# Altium footprint library ICs.PcbLib: 191 footprints (part 7 of 12)
Each footprint in its own frame and in the unit in brackets; x right, y up, seen from the top. Pads: shape width x height; smd on the part's side, far side on the other; paste and mask are expansions set on the pad; w line width, h text height; cw(c..) or ccw(c..) is an arc to the next point about the centre after c.
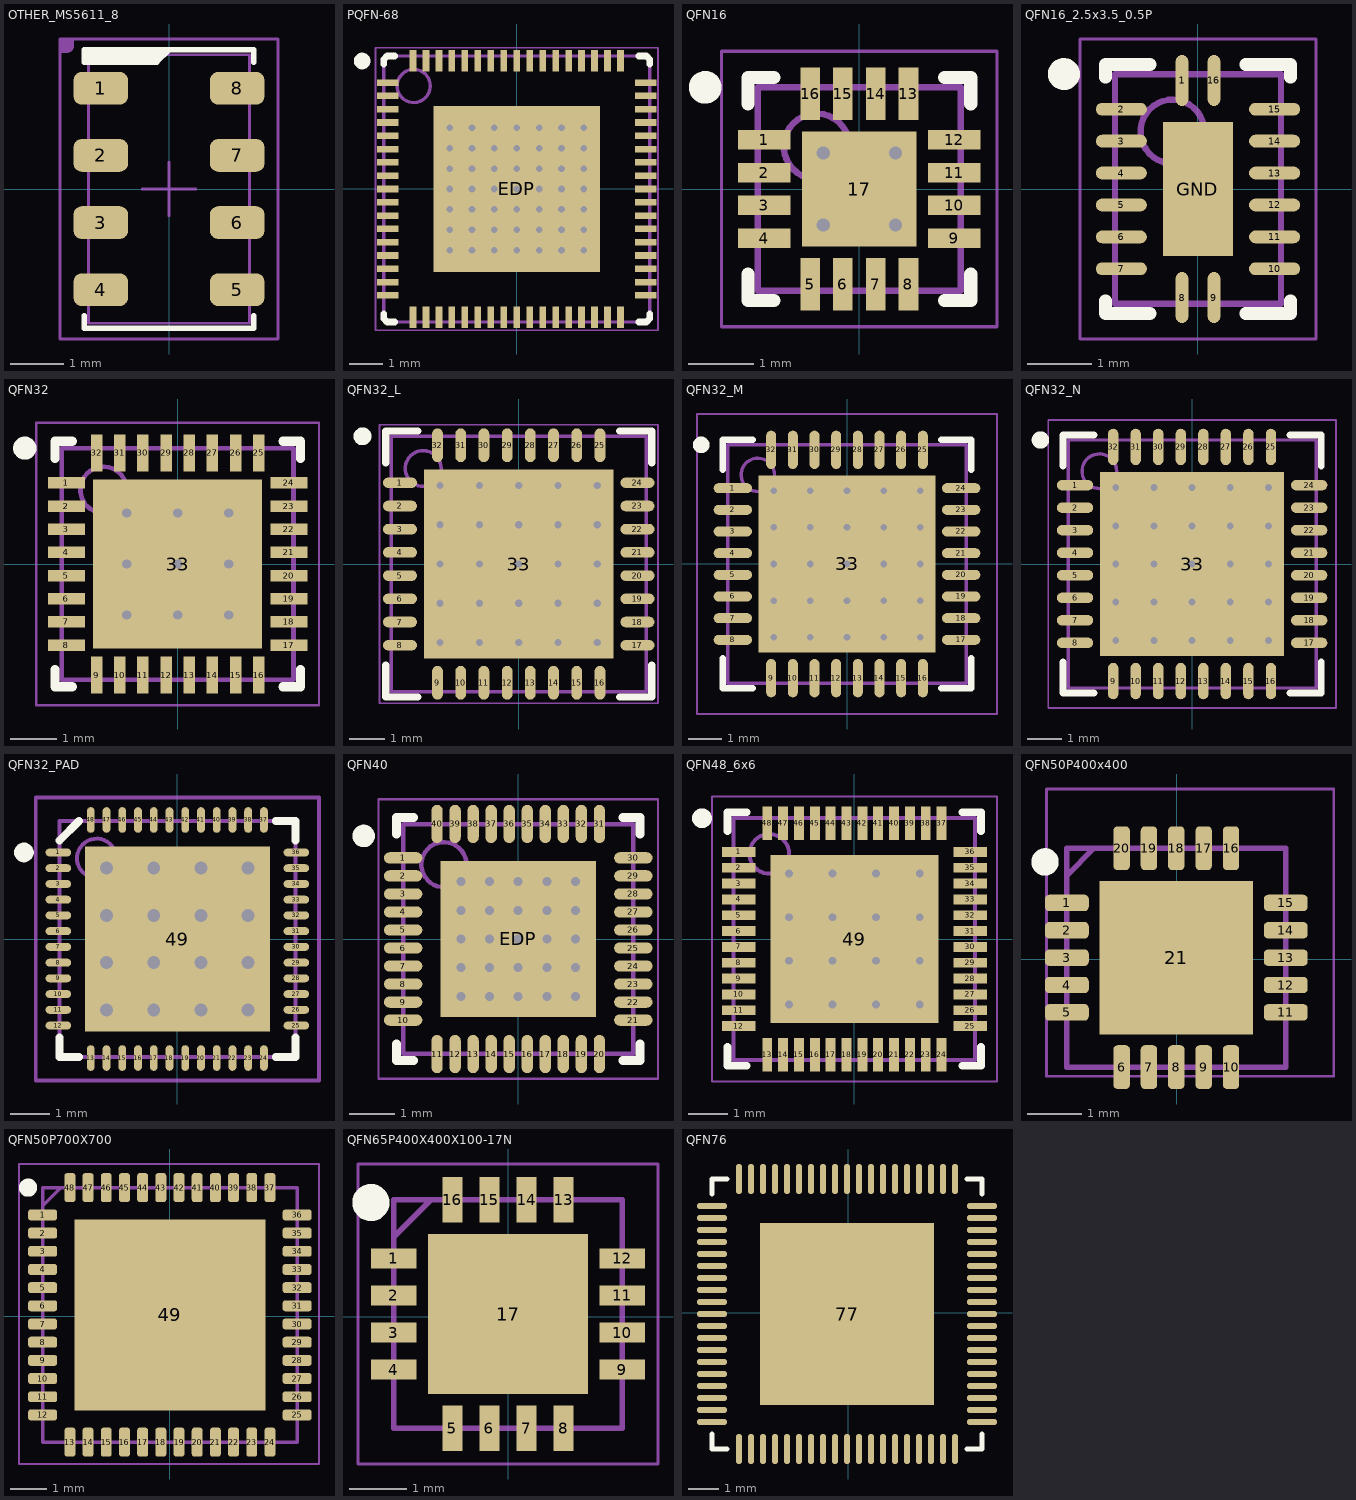
[diagram p6: the footprints below, top view; thin cyan lines are the x and y axes]

## OTHER_MS5611_8 [mil]
height 39.37
pads (8):
  rrect50% 40x24 smd: 1(-50,73.82) 2(-50,24.61) 3(-50,-24.61) 4(-50,-73.82) 5(50,-73.82) 6(50,-24.61) 7(50,24.61) 8(50,73.82)
Top Overlay:
  region: -62,102 0,102 -9,93 -62,93
  lines w4: -62,-93 -62,-102 62,-102 62,-93 ; 0,102 -9,93 -62,93 -62,102 62,102 62,93
Mechanical 13:
  lines w2: -19.68,0 19.68,0 ; 0,-19.68 0,19.68 ; -59.06,-98.43 59.06,-98.43 59.06,98.43 -59.06,98.43 -59.06,-98.43
Mechanical 14:
  region: -80,110 -70,110 -70,105 -70,104.01 -70.76,102.17 -72.17,100.76 -74.01,100 -75,100 -80,100
  lines w2: -80,-110 -80,110 80,110 80,-110 -80,-110
  text ".Designator" at -41,-25 h100
3D body "User Library-CRYSTALSMD5X32.STEP": height 39.37, standoff 0, extent -62.99,-98.43 63,98.43

## PQFN-68 [mm] "PQFN, 68-Leads, Body 7.95x7.95mm, Pitch 0.39mm/0.40mm, Thermal Pad 5.00x5.00mm, IPC Medium Density"
height 0.8
pads (69):
  rect 0.65x0.2 smd: 1(-3.88,3.2) 2(-3.88,2.8) 3(-3.88,2.4) 4(-3.88,2) 5(-3.88,1.6) 6(-3.88,1.2) 7(-3.88,0.8) 8(-3.88,0.4) 9(-3.88,0) 10(-3.88,-0.4) 11(-3.88,-0.8) 12(-3.88,-1.2) 13(-3.88,-1.6) 14(-3.88,-2) 15(-3.88,-2.4) 16(-3.88,-2.8) 17(-3.88,-3.2) 35(3.88,-3.2) 36(3.88,-2.8) 37(3.88,-2.4) 38(3.88,-2) 39(3.88,-1.6) 40(3.88,-1.2) 41(3.88,-0.8) 42(3.88,-0.4) 43(3.88,0) 44(3.88,0.4) 45(3.88,0.8) 46(3.88,1.2) 47(3.88,1.6) 48(3.88,2) 49(3.88,2.4) 50(3.88,2.8) 51(3.88,3.2)
  rect 0.2x0.65 smd: 18(-3.12,-3.854) 19(-2.73,-3.854) 20(-2.34,-3.854) 21(-1.95,-3.854) 22(-1.56,-3.854) 23(-1.17,-3.854) 24(-0.78,-3.854) 25(-0.39,-3.854) 26(0,-3.854) 27(0.39,-3.854) 28(0.78,-3.854) 29(1.17,-3.854) 30(1.56,-3.854) 31(1.95,-3.854) 32(2.34,-3.854) 33(2.73,-3.854) 34(3.12,-3.854) 52(3.12,3.854) 53(2.73,3.854) 54(2.34,3.854) 55(1.95,3.854) 56(1.56,3.854) 57(1.17,3.854) 58(0.78,3.854) 59(0.39,3.854) 60(0,3.854) 61(-0.39,3.854) 62(-0.78,3.854) 63(-1.17,3.854) 64(-1.56,3.854) 65(-1.95,3.854) 66(-2.34,3.854) 67(-2.73,3.854) 68(-3.12,3.854)
  rect 5x5 smd: EDP(0,0)
via 2.018,1.227 diameter 0.5 hole 0.2
via 2.018,0.613 diameter 0.5 hole 0.2
via 2.018,-1.84 diameter 0.5 hole 0.2
via 2.018,-1.227 diameter 0.5 hole 0.2
via 2.018,-0.613 diameter 0.5 hole 0.2
via 2.018,0 diameter 0.5 hole 0.2
via 2.018,1.84 diameter 0.5 hole 0.2
via 1.346,1.227 diameter 0.5 hole 0.2
via 1.346,0.613 diameter 0.5 hole 0.2
via 1.346,-1.84 diameter 0.5 hole 0.2
via 1.346,-1.227 diameter 0.5 hole 0.2
via 1.346,-0.613 diameter 0.5 hole 0.2
via 1.346,0 diameter 0.5 hole 0.2
via 1.346,1.84 diameter 0.5 hole 0.2
via 0,1.84 diameter 0.5 hole 0.2
via -0.673,1.84 diameter 0.5 hole 0.2
via -1.346,1.84 diameter 0.5 hole 0.2
via -2.018,1.84 diameter 0.5 hole 0.2
via 0.673,1.84 diameter 0.5 hole 0.2
via 0.673,0 diameter 0.5 hole 0.2
via 0.673,-0.613 diameter 0.5 hole 0.2
via 0.673,-1.227 diameter 0.5 hole 0.2
via 0.673,-1.84 diameter 0.5 hole 0.2
via 0.673,0.613 diameter 0.5 hole 0.2
via 0.673,1.227 diameter 0.5 hole 0.2
via -2.018,1.227 diameter 0.5 hole 0.2
via -1.346,1.227 diameter 0.5 hole 0.2
via -0.673,1.227 diameter 0.5 hole 0.2
via 0,1.227 diameter 0.5 hole 0.2
via -2.018,0.613 diameter 0.5 hole 0.2
via -1.346,0.613 diameter 0.5 hole 0.2
via -0.673,0.613 diameter 0.5 hole 0.2
via 0,0.613 diameter 0.5 hole 0.2
via 0,-1.84 diameter 0.5 hole 0.2
via -0.673,-1.84 diameter 0.5 hole 0.2
via -1.346,-1.84 diameter 0.5 hole 0.2
via -2.018,-1.84 diameter 0.5 hole 0.2
via 0,-1.227 diameter 0.5 hole 0.2
via -0.673,-1.227 diameter 0.5 hole 0.2
via -1.346,-1.227 diameter 0.5 hole 0.2
via -2.018,-1.227 diameter 0.5 hole 0.2
via 0,-0.613 diameter 0.5 hole 0.2
via -0.673,-0.613 diameter 0.5 hole 0.2
via -1.346,-0.613 diameter 0.5 hole 0.2
via -2.018,-0.613 diameter 0.5 hole 0.2
via 0,0 diameter 0.5 hole 0.2
via -0.673,0 diameter 0.5 hole 0.2
via -1.346,0 diameter 0.5 hole 0.2
via -2.018,0 diameter 0.5 hole 0.2
Top Overlay:
  circle w0.25: c-4.65,3.85 r0.125
  lines w0.2: -4,-3.75 -4,-3.9 -3.9,-4 -3.67,-4 ; -4,3.75 -4,3.9 -3.9,4 -3.67,4 ; 3.67,-4 3.9,-4 4,-3.9 4,-3.75 ; 3.67,4 3.9,4 4,3.9 4,3.75
Assembly Top:
  circle w0.1: c-3.1,3.1 r0.5
  lines w0.1: -4,-3.9 -4,3.9 -3.9,4 3.9,4 4,3.9 4,-3.9 3.9,-4 -3.9,-4 -4,-3.9
Courtyard Top:
  lines w0.05: -4.25,-4.25 4.25,-4.25 4.25,4.25 -4.25,4.25 -4.25,-4.25
  lines w0.1: -0.5,0 0.5,0 ; 0,-0.5 0,0.5
3D body "PQFN-68.step": height 0.8, standoff 0, extent -4,-4 4,4

## QFN16 [mm]
height 0.75
pads (17):
  rect 0.8x0.3 smd: 1(-1.45,0.75) 2(-1.45,0.25) 3(-1.45,-0.25) 4(-1.45,-0.75) 9(1.45,-0.75) 10(1.45,-0.25) 11(1.45,0.25) 12(1.45,0.75)
  rect 0.3x0.8 smd: 5(-0.75,-1.45) 6(-0.25,-1.45) 7(0.25,-1.45) 8(0.75,-1.45) 13(0.75,1.45) 14(0.25,1.45) 15(-0.25,1.45) 16(-0.75,1.45)
  rect 1.75x1.75 smd: 17(0,0)
via -0.55,0.55 diameter 0.5 hole 0.2
via 0.55,0.55 diameter 0.5 hole 0.2
via -0.55,-0.55 diameter 0.5 hole 0.2
via 0.55,-0.55 diameter 0.5 hole 0.2
Top Overlay:
  circle w0.25: c-2.35,1.55 r0.125
  lines w0.2: -1.7,-1.3 -1.7,-1.7 -1.3,-1.7 ; -1.7,1.3 -1.7,1.7 -1.3,1.7 ; 1.3,-1.7 1.7,-1.7 1.7,-1.3 ; 1.3,1.7 1.7,1.7 1.7,1.3
Mechanical 13:
  circle w0.1: c-0.65,0.65 r0.5
  lines w0.1: -1.55,-1.55 -1.55,1.55 1.55,1.55 1.55,-1.55 -1.55,-1.55
Mechanical 15:
  lines w0.05: -2.1,-2.1 -2.1,2.1 2.1,2.1 2.1,-2.1 -2.1,-2.1
  lines w0.1: -0.5,0 0.5,0 ; 0,-0.5 0,0.5
3D body "QFN16.step": height 0.75, standoff 0, extent -1.56,-1.56 1.56,1.56

## QFN16_2.5x3.5_0.5P [mm]
height 0.8
pads (17):
  oval 0.2x0.8 smd: 1(-0.25,1.7) 8(-0.25,-1.7) 9(0.25,-1.7) 16(0.25,1.7)
  oval 0.8x0.2 smd: 2(-1.2,1.25) 3(-1.2,0.75) 4(-1.2,0.25) 5(-1.2,-0.25) 6(-1.2,-0.75) 7(-1.2,-1.25) 10(1.2,-1.25) 11(1.2,-0.75) 12(1.2,-0.25) 13(1.2,0.25) 14(1.2,0.75) 15(1.2,1.25)
  rect 1.1x2.1 smd: GND(0,0)
Top Overlay:
  circle w0.25: c-2.1,1.8 r0.125
  lines w0.2: -1.45,-1.75 -1.45,-1.95 -0.75,-1.95 ; -1.45,1.75 -1.45,1.95 -0.75,1.95 ; 0.75,-1.95 1.45,-1.95 1.45,-1.75 ; 0.75,1.95 1.45,1.95 1.45,1.75
Mechanical 13:
  circle w0.1: c-0.4,0.9 r0.5
  lines w0.1: -1.3,-1.8 -1.3,1.8 1.3,1.8 1.3,-1.8 -1.3,-1.8
Mechanical 15:
  lines w0.05: -1.85,-2.35 -1.85,2.35 1.85,2.35 1.85,-2.35 -1.85,-2.35
  lines w0.1: -0.5,0 0.5,0 ; 0,-0.5 0,0.5
3D body "QFN116_2.5x3.5_0.5P.step": height 0.8, standoff 0, extent -1.32,-1.82 1.32,1.82

## QFN32 [mm]
height 0.75
pads (33):
  rect 0.8x0.25 smd: 1(-2.4,1.75) 2(-2.4,1.25) 3(-2.4,0.75) 4(-2.4,0.25) 5(-2.4,-0.25) 6(-2.4,-0.75) 7(-2.4,-1.25) 8(-2.4,-1.75) 17(2.4,-1.75) 18(2.4,-1.25) 19(2.4,-0.75) 20(2.4,-0.25) 21(2.4,0.25) 22(2.4,0.75) 23(2.4,1.25) 24(2.4,1.75)
  rect 0.25x0.8 smd: 9(-1.75,-2.4) 10(-1.25,-2.4) 11(-0.75,-2.4) 12(-0.25,-2.4) 13(0.25,-2.4) 14(0.75,-2.4) 15(1.25,-2.4) 16(1.75,-2.4) 25(1.75,2.4) 26(1.25,2.4) 27(0.75,2.4) 28(0.25,2.4) 29(-0.25,2.4) 30(-0.75,2.4) 31(-1.25,2.4) 32(-1.75,2.4)
  rect 3.65x3.65 smd: 33(0,0)
via 1.1,-1.1 diameter 0.5 hole 0.2
via 0,-1.1 diameter 0.5 hole 0.2
via -1.1,-1.1 diameter 0.5 hole 0.2
via 1.1,0 diameter 0.5 hole 0.2
via 0,0 diameter 0.5 hole 0.2
via -1.1,0 diameter 0.5 hole 0.2
via 1.1,1.1 diameter 0.5 hole 0.2
via 0,1.1 diameter 0.5 hole 0.2
via -1.1,1.1 diameter 0.5 hole 0.2
Top Overlay:
  circle w0.25: c-3.3,2.5 r0.125
  lines w0.2: -2.65,-2.275 -2.65,-2.65 -2.275,-2.65 ; -2.65,2.275 -2.65,2.65 -2.275,2.65 ; 2.275,-2.65 2.65,-2.65 2.65,-2.275 ; 2.275,2.65 2.65,2.65 2.65,2.275
Mechanical 13:
  circle w0.1: c-1.6,1.6 r0.5
  lines w0.1: -2.5,-2.5 2.5,-2.5 2.5,2.5 -2.5,2.5 -2.5,-2.5
Mechanical 15:
  lines w0.05: -3.05,-3.05 3.05,-3.05 3.05,3.05 -3.05,3.05 -3.05,-3.05
  lines w0.1: -0.5,0 0.5,0 ; 0,-0.5 0,0.5
3D body "QFN32.step": height 0.75, standoff 0, extent -2.51,-2.51 2.51,2.51

## QFN32_L [mm] "QFN, 32-Leads, Body 7x7mm, Pitch 0.65mm, Thermal Pad 5.3x5.3mm, IPC High Density"
height 1
pads (33):
  oval 0.95x0.3 smd: 1(-3.325,2.275) 2(-3.325,1.625) 3(-3.325,0.975) 4(-3.325,0.325) 5(-3.325,-0.325) 6(-3.325,-0.975) 7(-3.325,-1.625) 8(-3.325,-2.275) 17(3.325,-2.275) 18(3.325,-1.625) 19(3.325,-0.975) 20(3.325,-0.325) 21(3.325,0.325) 22(3.325,0.975) 23(3.325,1.625) 24(3.325,2.275)
  oval 0.3x0.95 smd: 9(-2.275,-3.325) 10(-1.625,-3.325) 11(-0.975,-3.325) 12(-0.325,-3.325) 13(0.325,-3.325) 14(0.975,-3.325) 15(1.625,-3.325) 16(2.275,-3.325) 25(2.275,3.325) 26(1.625,3.325) 27(0.975,3.325) 28(0.325,3.325) 29(-0.325,3.325) 30(-0.975,3.325) 31(-1.625,3.325) 32(-2.275,3.325)
  rect 5.3x5.3 smd: 33(0,0)
via -2.2,2.2 diameter 0.5 hole 0.2
via -1.1,2.2 diameter 0.5 hole 0.2
via 0,2.2 diameter 0.5 hole 0.2
via 1.1,2.2 diameter 0.5 hole 0.2
via 2.2,2.2 diameter 0.5 hole 0.2
via -2.2,1.1 diameter 0.5 hole 0.2
via -1.1,1.1 diameter 0.5 hole 0.2
via 0,1.1 diameter 0.5 hole 0.2
via 1.1,1.1 diameter 0.5 hole 0.2
via 2.2,1.1 diameter 0.5 hole 0.2
via -2.2,0 diameter 0.5 hole 0.2
via -1.1,0 diameter 0.5 hole 0.2
via 0,0 diameter 0.5 hole 0.2
via 1.1,0 diameter 0.5 hole 0.2
via 2.2,0 diameter 0.5 hole 0.2
via -2.2,-1.1 diameter 0.5 hole 0.2
via -1.1,-1.1 diameter 0.5 hole 0.2
via 0,-1.1 diameter 0.5 hole 0.2
via 1.1,-1.1 diameter 0.5 hole 0.2
via 2.2,-1.1 diameter 0.5 hole 0.2
via -2.2,-2.2 diameter 0.5 hole 0.2
via -1.1,-2.2 diameter 0.5 hole 0.2
via 0,-2.2 diameter 0.5 hole 0.2
via 1.1,-2.2 diameter 0.5 hole 0.2
via 2.2,-2.2 diameter 0.5 hole 0.2
Top Overlay:
  circle w0.25: c-4.375,3.575 r0.125
  lines w0.2: -3.725,-2.825 -3.725,-3.725 -2.825,-3.725 ; -3.725,2.825 -3.725,3.725 -2.825,3.725 ; 2.825,-3.725 3.725,-3.725 3.725,-2.825 ; 2.825,3.725 3.725,3.725 3.725,2.825
Mechanical 13:
  circle w0.1: c-2.675,2.675 r0.5
  lines w0.1: -3.575,-3.575 -3.575,3.575 3.575,3.575 3.575,-3.575 -3.575,-3.575
Mechanical 15:
  lines w0.05: -3.9,-3.9 -3.9,3.9 3.9,3.9 3.9,-3.9 -3.9,-3.9
  lines w0.1: -0.5,0 0.5,0 ; 0,-0.5 0,0.5
3D body: height 1, standoff 0, extent -3.575,-3.575 3.575,3.575

## QFN32_M [mm] "QFN, 32-Leads, Body 7x7mm, Pitch 0.65mm, Thermal Pad 5.3x5.3mm, IPC Low Density"
height 1
pads (33):
  oval 1.15x0.3 smd: 1(-3.425,2.275) 2(-3.425,1.625) 3(-3.425,0.975) 4(-3.425,0.325) 5(-3.425,-0.325) 6(-3.425,-0.975) 7(-3.425,-1.625) 8(-3.425,-2.275) 17(3.425,-2.275) 18(3.425,-1.625) 19(3.425,-0.975) 20(3.425,-0.325) 21(3.425,0.325) 22(3.425,0.975) 23(3.425,1.625) 24(3.425,2.275)
  oval 0.3x1.15 smd: 9(-2.275,-3.425) 10(-1.625,-3.425) 11(-0.975,-3.425) 12(-0.325,-3.425) 13(0.325,-3.425) 14(0.975,-3.425) 15(1.625,-3.425) 16(2.275,-3.425) 25(2.275,3.425) 26(1.625,3.425) 27(0.975,3.425) 28(0.325,3.425) 29(-0.325,3.425) 30(-0.975,3.425) 31(-1.625,3.425) 32(-2.275,3.425)
  rect 5.3x5.3 smd: 33(0,0)
via 2.2,-2.2 diameter 0.5 hole 0.2
via 1.1,-2.2 diameter 0.5 hole 0.2
via 0,-2.2 diameter 0.5 hole 0.2
via -1.1,-2.2 diameter 0.5 hole 0.2
via -2.2,-2.2 diameter 0.5 hole 0.2
via 2.2,-1.1 diameter 0.5 hole 0.2
via 1.1,-1.1 diameter 0.5 hole 0.2
via 0,-1.1 diameter 0.5 hole 0.2
via -1.1,-1.1 diameter 0.5 hole 0.2
via -2.2,-1.1 diameter 0.5 hole 0.2
via 2.2,0 diameter 0.5 hole 0.2
via 1.1,0 diameter 0.5 hole 0.2
via 0,0 diameter 0.5 hole 0.2
via -1.1,0 diameter 0.5 hole 0.2
via -2.2,0 diameter 0.5 hole 0.2
via 2.2,1.1 diameter 0.5 hole 0.2
via 1.1,1.1 diameter 0.5 hole 0.2
via 0,1.1 diameter 0.5 hole 0.2
via -1.1,1.1 diameter 0.5 hole 0.2
via -2.2,1.1 diameter 0.5 hole 0.2
via 2.2,2.2 diameter 0.5 hole 0.2
via 1.1,2.2 diameter 0.5 hole 0.2
via 0,2.2 diameter 0.5 hole 0.2
via -1.1,2.2 diameter 0.5 hole 0.2
via -2.2,2.2 diameter 0.5 hole 0.2
Top Overlay:
  circle w0.25: c-4.375,3.575 r0.125
  lines w0.2: -3.725,-2.825 -3.725,-3.725 -2.825,-3.725 ; -3.725,2.825 -3.725,3.725 -2.825,3.725 ; 2.825,-3.725 3.725,-3.725 3.725,-2.825 ; 2.825,3.725 3.725,3.725 3.725,2.825
Mechanical 13:
  circle w0.1: c-2.675,2.675 r0.5
  lines w0.1: -3.575,-3.575 3.575,-3.575 3.575,3.575 -3.575,3.575 -3.575,-3.575
Mechanical 15:
  lines w0.05: -4.5,-4.5 4.5,-4.5 4.5,4.5 -4.5,4.5 -4.5,-4.5
  lines w0.1: -0.5,0 0.5,0 ; 0,-0.5 0,0.5
3D body: height 1, standoff 0, extent -3.575,-3.575 3.575,3.575

## QFN32_N [mm] "QFN, 32-Leads, Body 7x7mm, Pitch 0.65mm, Thermal Pad 5.3x5.3mm, IPC Medium Density"
height 1
pads (33):
  oval 1.05x0.3 smd: 1(-3.375,2.275) 2(-3.375,1.625) 3(-3.375,0.975) 4(-3.375,0.325) 5(-3.375,-0.325) 6(-3.375,-0.975) 7(-3.375,-1.625) 8(-3.375,-2.275) 17(3.375,-2.275) 18(3.375,-1.625) 19(3.375,-0.975) 20(3.375,-0.325) 21(3.375,0.325) 22(3.375,0.975) 23(3.375,1.625) 24(3.375,2.275)
  oval 0.3x1.05 smd: 9(-2.275,-3.375) 10(-1.625,-3.375) 11(-0.975,-3.375) 12(-0.325,-3.375) 13(0.325,-3.375) 14(0.975,-3.375) 15(1.625,-3.375) 16(2.275,-3.375) 25(2.275,3.375) 26(1.625,3.375) 27(0.975,3.375) 28(0.325,3.375) 29(-0.325,3.375) 30(-0.975,3.375) 31(-1.625,3.375) 32(-2.275,3.375)
  rect 5.3x5.3 smd: 33(0,0)
via 2.2,-2.2 diameter 0.5 hole 0.2
via 1.1,-2.2 diameter 0.5 hole 0.2
via 0,-2.2 diameter 0.5 hole 0.2
via -1.1,-2.2 diameter 0.5 hole 0.2
via -2.2,-2.2 diameter 0.5 hole 0.2
via 2.2,-1.1 diameter 0.5 hole 0.2
via 1.1,-1.1 diameter 0.5 hole 0.2
via 0,-1.1 diameter 0.5 hole 0.2
via -1.1,-1.1 diameter 0.5 hole 0.2
via -2.2,-1.1 diameter 0.5 hole 0.2
via 2.2,0 diameter 0.5 hole 0.2
via 1.1,0 diameter 0.5 hole 0.2
via 0,0 diameter 0.5 hole 0.2
via -1.1,0 diameter 0.5 hole 0.2
via -2.2,0 diameter 0.5 hole 0.2
via 2.2,1.1 diameter 0.5 hole 0.2
via 1.1,1.1 diameter 0.5 hole 0.2
via 0,1.1 diameter 0.5 hole 0.2
via -1.1,1.1 diameter 0.5 hole 0.2
via -2.2,1.1 diameter 0.5 hole 0.2
via 2.2,2.2 diameter 0.5 hole 0.2
via 1.1,2.2 diameter 0.5 hole 0.2
via 0,2.2 diameter 0.5 hole 0.2
via -1.1,2.2 diameter 0.5 hole 0.2
via -2.2,2.2 diameter 0.5 hole 0.2
Top Overlay:
  circle w0.25: c-4.375,3.575 r0.125
  lines w0.2: -3.725,-2.825 -3.725,-3.725 -2.825,-3.725 ; -3.725,2.825 -3.725,3.725 -2.825,3.725 ; 2.825,-3.725 3.725,-3.725 3.725,-2.825 ; 2.825,3.725 3.725,3.725 3.725,2.825
Mechanical 13:
  circle w0.1: c-2.675,2.675 r0.5
  lines w0.1: -3.575,-3.575 3.575,-3.575 3.575,3.575 -3.575,3.575 -3.575,-3.575
Mechanical 15:
  lines w0.05: -4.15,-4.15 4.15,-4.15 4.15,4.15 -4.15,4.15 -4.15,-4.15
  lines w0.1: -0.5,0 0.5,0 ; 0,-0.5 0,0.5
3D body: height 1, standoff 0, extent -3.575,-3.575 3.575,3.575

## QFN32_PAD [mm]
pads (49):
  oval 0.65x0.2 smd: 1(-3.025,2.2) 2(-3.025,1.8) 3(-3.025,1.4) 4(-3.025,1) 5(-3.025,0.6) 6(-3.025,0.2) 7(-3.025,-0.2) 8(-3.025,-0.6) 9(-3.025,-1) 10(-3.025,-1.4) 11(-3.025,-1.8) 12(-3.025,-2.2) 25(3.025,-2.2) 26(3.025,-1.8) 27(3.025,-1.4) 28(3.025,-1) 29(3.025,-0.6) 30(3.025,-0.2) 31(3.025,0.2) 32(3.025,0.6) 33(3.025,1) 34(3.025,1.4) 35(3.025,1.8) 36(3.025,2.2)
  oval 0.2x0.65 smd: 13(-2.2,-3.025) 14(-1.8,-3.025) 15(-1.4,-3.025) 16(-1,-3.025) 17(-0.6,-3.025) 18(-0.2,-3.025) 19(0.2,-3.025) 20(0.6,-3.025) 21(1,-3.025) 22(1.4,-3.025) 23(1.8,-3.025) 24(2.2,-3.025) 37(2.2,3.025) 38(1.8,3.025) 39(1.4,3.025) 40(1,3.025) 41(0.6,3.025) 42(0.2,3.025) 43(-0.2,3.025) 44(-0.6,3.025) 45(-1,3.025) 46(-1.4,3.025) 47(-1.8,3.025) 48(-2.2,3.025)
  rect 4.7x4.7 smd: 49(0,0)
via 1.8,-1.8 diameter 0.66 hole 0.33
via 0.6,-1.8 diameter 0.66 hole 0.33
via -0.6,-1.8 diameter 0.66 hole 0.33
via -1.8,-1.8 diameter 0.66 hole 0.33
via 1.8,-0.6 diameter 0.66 hole 0.33
via 0.6,-0.6 diameter 0.66 hole 0.33
via -0.6,-0.6 diameter 0.66 hole 0.33
via -1.8,-0.6 diameter 0.66 hole 0.33
via 1.8,0.6 diameter 0.66 hole 0.33
via 0.6,0.6 diameter 0.66 hole 0.33
via -0.6,0.6 diameter 0.66 hole 0.33
via -1.8,0.6 diameter 0.66 hole 0.33
via 1.8,1.8 diameter 0.66 hole 0.33
via 0.6,1.8 diameter 0.66 hole 0.33
via -0.6,1.8 diameter 0.66 hole 0.33
via -1.8,1.8 diameter 0.66 hole 0.33
Top Overlay:
  circle w0.25: c-3.9,2.2 r0.125
  lines w0.2: -3,-2.5 -3,-3 -2.5,-3 ; -3,2.5 -2.5,3 ; 2.5,-3 3,-3 3,-2.5 ; 2.5,3 3,3 3,2.5
Mechanical 13:
  circle w0.1: c-2.05,2.05 r0.5
  lines w0.1: -3,-3 3,-3 3,3 -3,3 -3,-3
Mechanical 15:
  lines w0.1: -0.5,0 0.5,0 ; 0,-0.5 0,0.5 ; -3.6,-3.6 3.6,-3.6 3.6,3.6 -3.6,3.6 -3.6,-3.6
3D body "User Library-QFN48.step": height 0.86, standoff -0.01, extent -3.02,-3.02 3.02,3.02

## QFN40 [mm]
pads (41):
  oval 0.85x0.25 smd: 1(-2.553,1.801) 2(-2.553,1.401) 3(-2.553,1.001) 4(-2.553,0.601) 5(-2.553,0.201) 6(-2.553,-0.199) 7(-2.553,-0.599) 8(-2.553,-0.999) 9(-2.553,-1.399) 10(-2.553,-1.799) 21(2.551,-1.799) 22(2.551,-1.399) 23(2.551,-0.999) 24(2.551,-0.599) 25(2.551,-0.199) 26(2.551,0.201) 27(2.551,0.601) 28(2.551,1.001) 29(2.551,1.401) 30(2.551,1.801)
  oval 0.25x0.85 smd: 11(-1.801,-2.551) 12(-1.401,-2.551) 13(-1.001,-2.551) 14(-0.601,-2.551) 15(-0.201,-2.551) 16(0.199,-2.551) 17(0.599,-2.551) 18(0.999,-2.551) 19(1.399,-2.551) 20(1.799,-2.551) 31(1.799,2.553) 32(1.399,2.553) 33(0.999,2.553) 34(0.599,2.553) 35(0.199,2.553) 36(-0.201,2.553) 37(-0.601,2.553) 38(-1.001,2.553) 39(-1.401,2.553) 40(-1.801,2.553)
  rect 3.45x3.45 smd: EDP(-0.001,0.001)
via -0.001,1.271 diameter 0.5 hole 0.2
via 0.634,1.271 diameter 0.5 hole 0.2
via 1.269,1.271 diameter 0.5 hole 0.2
via -1.271,1.271 diameter 0.5 hole 0.2
via -0.636,1.271 diameter 0.5 hole 0.2
via -0.001,0.636 diameter 0.5 hole 0.2
via 0.634,0.636 diameter 0.5 hole 0.2
via 1.269,0.636 diameter 0.5 hole 0.2
via -1.271,0.636 diameter 0.5 hole 0.2
via -0.636,0.636 diameter 0.5 hole 0.2
via -0.001,0.001 diameter 0.5 hole 0.2
via 0.634,0.001 diameter 0.5 hole 0.2
via 1.269,0.001 diameter 0.5 hole 0.2
via -1.271,0.001 diameter 0.5 hole 0.2
via -0.636,0.001 diameter 0.5 hole 0.2
via -0.001,-0.634 diameter 0.5 hole 0.2
via 0.634,-0.634 diameter 0.5 hole 0.2
via 1.269,-0.634 diameter 0.5 hole 0.2
via -1.271,-0.634 diameter 0.5 hole 0.2
via -0.636,-0.634 diameter 0.5 hole 0.2
via -0.636,-1.269 diameter 0.5 hole 0.2
via -1.271,-1.269 diameter 0.5 hole 0.2
via 1.269,-1.269 diameter 0.5 hole 0.2
via 0.634,-1.269 diameter 0.5 hole 0.2
via -0.001,-1.269 diameter 0.5 hole 0.2
Top Overlay:
  circle w0.25: c-3.43,2.287 r0.125
  lines w0.2: -2.701,-2.324 -2.701,-2.699 -2.326,-2.699 ; -2.701,2.326 -2.701,2.701 -2.326,2.701 ; 2.324,-2.699 2.699,-2.699 2.699,-2.324 ; 2.324,2.701 2.699,2.701 2.699,2.326
Assembly Bottom:
  circle w0.1: c-1.651,1.651 r0.5
  lines w0.1: -2.551,-2.549 2.549,-2.549 2.549,2.551 -2.551,2.551 -2.551,-2.549
3D Body Top:
  lines w0.05: -3.101,-3.099 3.099,-3.099 3.099,3.101 -3.101,3.101 -3.101,-3.099
  lines w0.1: -0.501,0.001 0.499,0.001 ; -0.001,-0.499 -0.001,0.501
3D body: height 0.25, standoff 0, extent -2.571,-2.569 2.569,2.571

## QFN48_6x6 [mm] "QFN, 48-Leads, Body 6.05x6.05mm, Pitch 0.40mm, Thermal Pad 4.25x4.25mm, IPC Medium Density"
height 0.8
pads (49):
  rect 0.85x0.25 smd: 1(-2.925,2.2) 2(-2.925,1.8) 3(-2.925,1.4) 4(-2.925,1) 5(-2.925,0.6) 6(-2.925,0.2) 7(-2.925,-0.2) 8(-2.925,-0.6) 9(-2.925,-1) 10(-2.925,-1.4) 11(-2.925,-1.8) 12(-2.925,-2.2) 25(2.925,-2.2) 26(2.925,-1.8) 27(2.925,-1.4) 28(2.925,-1) 29(2.925,-0.6) 30(2.925,-0.2) 31(2.925,0.2) 32(2.925,0.6) 33(2.925,1) 34(2.925,1.4) 35(2.925,1.8) 36(2.925,2.2)
  rect 0.25x0.85 smd: 13(-2.2,-2.925) 14(-1.8,-2.925) 15(-1.4,-2.925) 16(-1,-2.925) 17(-0.6,-2.925) 18(-0.2,-2.925) 19(0.2,-2.925) 20(0.6,-2.925) 21(1,-2.925) 22(1.4,-2.925) 23(1.8,-2.925) 24(2.2,-2.925) 37(2.2,2.925) 38(1.8,2.925) 39(1.4,2.925) 40(1,2.925) 41(0.6,2.925) 42(0.2,2.925) 43(-0.2,2.925) 44(-0.6,2.925) 45(-1,2.925) 46(-1.4,2.925) 47(-1.8,2.925) 48(-2.2,2.925)
  rect 4.25x4.25 smd: 49(0,0)
via 1.65,-1.65 diameter 0.5 hole 0.2
via 0.55,-1.65 diameter 0.5 hole 0.2
via -0.55,-1.65 diameter 0.5 hole 0.2
via -1.65,-1.65 diameter 0.5 hole 0.2
via 1.65,-0.55 diameter 0.5 hole 0.2
via 0.55,-0.55 diameter 0.5 hole 0.2
via -0.55,-0.55 diameter 0.5 hole 0.2
via -1.65,-0.55 diameter 0.5 hole 0.2
via 1.65,0.55 diameter 0.5 hole 0.2
via 0.55,0.55 diameter 0.5 hole 0.2
via -0.55,0.55 diameter 0.5 hole 0.2
via -1.65,0.55 diameter 0.5 hole 0.2
via 1.65,1.65 diameter 0.5 hole 0.2
via 0.55,1.65 diameter 0.5 hole 0.2
via -0.55,1.65 diameter 0.5 hole 0.2
via -1.65,1.65 diameter 0.5 hole 0.2
Top Overlay:
  circle w0.25: c-3.85,3.05 r0.125
  lines w0.2: -3.2,-2.725 -3.2,-3.2 -2.725,-3.2 ; -3.2,2.725 -3.2,3.2 -2.725,3.2 ; 2.725,-3.2 3.2,-3.2 3.2,-2.725 ; 2.725,3.2 3.2,3.2 3.2,2.725
Mechanical 13:
  circle w0.1: c-2.15,2.15 r0.5
  lines w0.1: -3.05,-3.05 3.05,-3.05 3.05,3.05 -3.05,3.05 -3.05,-3.05
Mechanical 15:
  lines w0.05: -3.6,-3.6 3.6,-3.6 3.6,3.6 -3.6,3.6 -3.6,-3.6
  lines w0.1: -0.5,0 0.5,0 ; 0,-0.5 0,0.5
3D body "QFN48_6x6.step": height 0.8, standoff 0, extent -3.06,-3.06 3.06,3.06

## QFN50P400x400 [mm]
pads (21):
  rrect50% 0.8x0.3 smd: 1(-2.011,1.025) 2(-2.011,0.525) 3(-2.011,0.025) 4(-2.011,-0.475) 5(-2.011,-0.975) 11(1.989,-0.975) 12(1.989,-0.475) 13(1.989,0.025) 14(1.989,0.525) 15(1.989,1.025)
  rrect50% 0.3x0.8 smd: 6(-1.011,-1.975) 7(-0.511,-1.975) 8(-0.011,-1.975) 9(0.489,-1.975) 10(0.989,-1.975) 16(0.989,2.025) 17(0.489,2.025) 18(-0.011,2.025) 19(-0.511,2.025) 20(-1.011,2.025)
  rrect0% 2.8x2.8 smd: 21(-0.011,0.025)
Top Overlay:
  circle w0.25: c-2.411,1.775 r0.125
Mechanical 15:
  lines w0.1: -2.011,1.525 -1.511,2.025 ; -2.011,-1.975 1.989,-1.975 1.989,2.025 -2.011,2.025 -2.011,-1.975
Mechanical 20:
  lines w0.05: -2.382,-2.142 2.868,-2.142 2.868,3.108 -2.382,3.108 -2.382,-2.142
3D body "MCP73871-2CCI_ML.stp": height 1, standoff 0, extent -2.057,-2.017 2.043,2.083

## QFN50P700X700 [mm]
pads (49):
  rrect50% 0.8x0.3 smd: 1(-3.5,2.781) 2(-3.5,2.281) 3(-3.5,1.781) 4(-3.5,1.281) 5(-3.5,0.781) 6(-3.5,0.281) 7(-3.5,-0.219) 8(-3.5,-0.719) 9(-3.5,-1.219) 10(-3.5,-1.719) 11(-3.5,-2.219) 12(-3.5,-2.719) 25(3.5,-2.719) 26(3.5,-2.219) 27(3.5,-1.719) 28(3.5,-1.219) 29(3.5,-0.719) 30(3.5,-0.219) 31(3.5,0.281) 32(3.5,0.781) 33(3.5,1.281) 34(3.5,1.781) 35(3.5,2.281) 36(3.5,2.781)
  rrect50% 0.3x0.8 smd: 13(-2.75,-3.469) 14(-2.25,-3.469) 15(-1.75,-3.469) 16(-1.25,-3.469) 17(-0.75,-3.469) 18(-0.25,-3.469) 19(0.25,-3.469) 20(0.75,-3.469) 21(1.25,-3.469) 22(1.75,-3.469) 23(2.25,-3.469) 24(2.75,-3.469) 37(2.75,3.531) 38(2.25,3.531) 39(1.75,3.531) 40(1.25,3.531) 41(0.75,3.531) 42(0.25,3.531) 43(-0.25,3.531) 44(-0.75,3.531) 45(-1.25,3.531) 46(-1.75,3.531) 47(-2.25,3.531) 48(-2.75,3.531)
  rrect0% 5.25x5.25 smd: 49(0,0.031)
Top Overlay:
  circle w0.25: c-3.9,3.531 r0.125
Mechanical 15:
  lines w0.1: -3.5,3.031 -3,3.531 ; -3.5,-3.469 3.5,-3.469 3.5,3.531 -3.5,3.531 -3.5,-3.469
Mechanical 20:
  lines w0.05: -4.15,-4.069 4.1,-4.069 4.1,4.181 -4.15,4.181 -4.15,-4.069
3D body "ATSAMD21G18A-MUT.stp": height 0.9, standoff 0, extent -3.552,-3.52 3.548,3.58

## QFN65P400X400X100-17N [mm]
pads (17):
  rect 0.8x0.35 smd: 1(-2,1.026) 2(-2,0.376) 3(-2,-0.274) 4(-2,-0.924) 9(2,-0.924) 10(2,-0.274) 11(2,0.376) 12(2,1.026)
  rect 0.35x0.8 smd: 5(-0.975,-1.949) 6(-0.325,-1.949) 7(0.325,-1.949) 8(0.975,-1.949) 13(0.975,2.051) 14(0.325,2.051) 15(-0.325,2.051) 16(-0.975,2.051)
  rrect0% 2.8x2.8 smd: 17(0,0.051)
Top Overlay:
  circle w0.325: c-2.401,2.001 r0.162
Mechanical 15:
  lines w0.1: -2,1.401 -1.35,2.051 ; -2,-1.949 2,-1.949 2,2.051 -2,2.051 -2,-1.949
Mechanical 20:
  lines w0.05: -2.625,-2.574 2.625,-2.574 2.625,2.676 -2.625,2.676 -2.625,-2.574
3D body "TPS61090RSAR.stp": height 1, standoff 0, extent -2.032,-1.992 2.068,2.108

## QFN68_8x8 [mm]

## QFN76 [mm]
pads (77):
  oval 1x0.2 smd: 1(-4.535,3.558) 2(-4.535,3.158) 3(-4.535,2.758) 4(-4.535,2.358) 5(-4.535,1.958) 6(-4.535,1.558) 7(-4.535,1.158) 8(-4.535,0.758) 9(-4.535,0.358) 10(-4.535,-0.042) 11(-4.535,-0.442) 12(-4.535,-0.842) 13(-4.535,-1.242) 14(-4.535,-1.642) 15(-4.535,-2.042) 16(-4.535,-2.442) 17(-4.535,-2.842) 18(-4.535,-3.242) 19(-4.535,-3.642) 39(4.465,-3.642) 40(4.465,-3.242) 41(4.465,-2.842) 42(4.465,-2.442) 43(4.465,-2.042) 44(4.465,-1.642) 45(4.465,-1.242) 46(4.465,-0.842) 47(4.465,-0.442) 48(4.465,-0.042) 49(4.465,0.358) 50(4.465,0.758) 51(4.465,1.158) 52(4.465,1.558) 53(4.465,1.958) 54(4.465,2.358) 55(4.465,2.758) 56(4.465,3.158) 57(4.465,3.558)
  oval 0.2x1 smd: 20(-3.635,-4.542) 21(-3.235,-4.542) 22(-2.835,-4.542) 23(-2.435,-4.542) 24(-2.035,-4.542) 25(-1.635,-4.542) 26(-1.235,-4.542) 27(-0.835,-4.542) 28(-0.435,-4.542) 29(-0.035,-4.542) 30(0.365,-4.542) 31(0.765,-4.542) 32(1.165,-4.542) 33(1.565,-4.542) 34(1.965,-4.542) 35(2.365,-4.542) 36(2.765,-4.542) 37(3.165,-4.542) 38(3.565,-4.542) 58(3.565,4.458) 59(3.165,4.458) 60(2.765,4.458) 61(2.365,4.458) 62(1.965,4.458) 63(1.565,4.458) 64(1.165,4.458) 65(0.765,4.458) 66(0.365,4.458) 67(-0.035,4.458) 68(-0.435,4.458) 69(-0.835,4.458) 70(-1.235,4.458) 71(-1.635,4.458) 72(-2.035,4.458) 73(-2.435,4.458) 74(-2.835,4.458) 75(-3.235,4.458) 76(-3.635,4.458)
  rect 5.81x6.06 smd: 77(-0.035,-0.042)
Top Overlay:
  lines w0.15: -4.535,-4.042 -4.535,-4.542 -4.035,-4.542 ; -4.535,3.958 -4.535,4.458 -4.035,4.458 ; 3.965,-4.542 4.465,-4.542 4.465,-4.042 ; 3.965,4.458 4.465,4.458 4.465,3.958